# Altium footprint library nira_avr_dev_board.PcbLib: 49 footprints (part 3 of 4)
Each footprint in its own frame and in the unit in brackets; x right, y up, seen from the top. Pads: shape width x height; smd on the part's side, far side on the other; paste and mask are expansions set on the pad; w line width, h text height; cw(c..) or ccw(c..) is an arc to the next point about the centre after c.
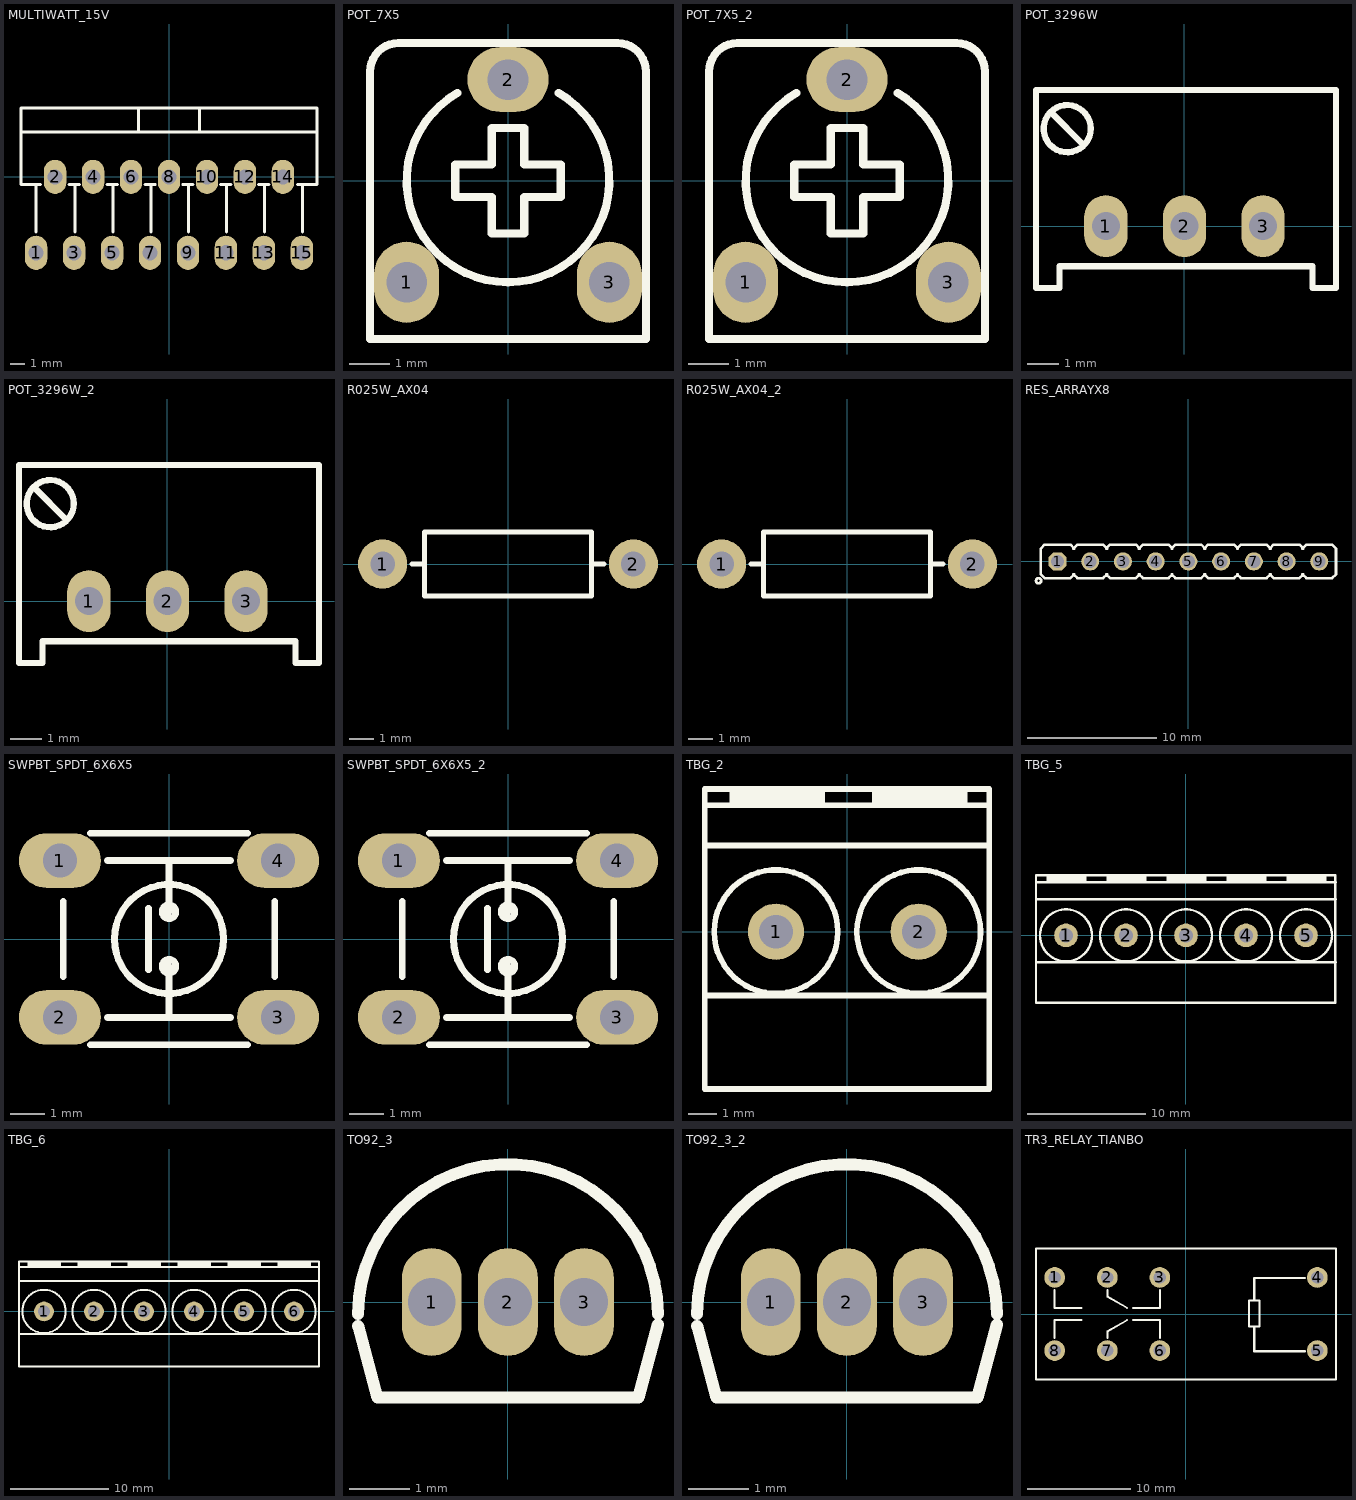
[diagram p2: the footprints below, top view; thin cyan lines are the x and y axes]

## MULTIWATT_15V [mil] "L298 straight MULTIWATT15 pitch: 1.27mm 20x5mm"
height 314.96
pads (15):
  oval 59.06x90 hole 40: 1(-350,-200) 2(-300,0) 3(-250,-200) 4(-200,0) 5(-150,-200) 6(-100,0) 7(-50,-200) 8(0,0) 9(50,-200) 10(100,0) 11(150,-200) 12(200,0) 13(250,-200) 14(300,0) 15(350,-200)
Top Overlay:
  lines w7.87: -389.76,118.11 389.76,118.11 ; -350.39,-145.67 -350.39,-20 ; -338.58,-20 -389.76,-20 -389.76,181.1 389.76,181.1 389.76,-20 338.58,-20 ; -263.78,-19.68 -236.22,-19.68 ; -248.03,-145.67 -248.03,-19.68 ; -163.78,-19.68 -136.22,-19.68 ; -148.03,-145.67 -148.03,-19.68 ; -80,120 -80,180 ; -63.78,-19.68 -36.22,-19.68 ; -48.03,-145.67 -48.03,-19.68 ; 36.22,-19.68 63.78,-19.68 ; 51.97,-145.67 51.97,-19.68 ; 80,120 80,180 ; 136.22,-19.68 163.78,-19.68 ; 151.97,-145.67 151.97,-19.68 ; 236.22,-19.68 263.78,-19.68 ; 251.97,-145.67 251.97,-19.68 ; 351.97,-145.67 351.97,-19.68
3D body "User Library-Multiwatt15V.STEP": height 818.9, standoff -59.06, extent -385.83,-212.6 385.83,176.77

## POT_7X5 [mm]
height 3.2
pads (3):
  oval 1.6x2 hole 1: 1(-2.5,-2.5) 3(2.5,-2.5)
  oval 2x1.6 hole 1: 2(0,2.5)
Top Overlay:
  lines w0.2: -1.25,2.165 ccw(c0,0) 1.25,2.165 ; -3.4,-3.9 -3.4,2.7 cw(c-2.7,2.7) -2.7,3.4 2.7,3.4 cw(c2.7,2.7) 3.4,2.7 3.4,-3.9 -3.4,-3.9 ; -1.3,-0.4 -1.3,0.4 -0.4,0.4 -0.4,1.3 0.4,1.3 0.4,0.4 1.3,0.4 1.3,-0.4 0.4,-0.4 0.4,-1.3 -0.4,-1.3 -0.4,-0.4 -1.3,-0.4
3D body "User Library-Pot - RES_VAR1.STEP": height 7, standoff -3.9, extent -3.25,-3.775 3.25,3.275

## POT_7X5_2 [mm]
pads (3):
  oval 1.6x2 hole 1: 1(-2.5,-2.5) 3(2.5,-2.5)
  oval 2x1.6 hole 1: 2(0,2.5)
Top Overlay:
  lines w0.2: -1.25,2.165 ccw(c0,0) 1.25,2.165 ; -3.4,-3.9 -3.4,2.7 cw(c-2.7,2.7) -2.7,3.4 2.7,3.4 cw(c2.7,2.7) 3.4,2.7 3.4,-3.9 -3.4,-3.9 ; -1.3,-0.4 -1.3,0.4 -0.4,0.4 -0.4,1.3 0.4,1.3 0.4,0.4 1.3,0.4 1.3,-0.4 0.4,-0.4 0.4,-1.3 -0.4,-1.3 -0.4,-0.4 -1.3,-0.4
3D body "User Library-Pot - RES_VAR1.STEP": height 7, standoff -3.9, extent -3.25,-3.775 3.25,3.275

## POT_3296W [mm]
height 3.2
pads (3):
  oval 1.4x2 / inner round 1.2 / far side oval 1.4x2 hole 0.9: 1(-2.54,0) 2(0,0) 3(2.54,0)
Top Overlay:
  circle w0.2: c-3.791,3.151 r0.762
  lines w0.2: -4.299,3.659 -3.283,2.643 ; -4.8,-2 -4.8,4.4 4.9,4.4 4.9,-2 4.145,-2 4.145,-1.3 -4.045,-1.3 -4.045,-2 -4.8,-2
3D body "pot 3299W-1-103RLF.step": height 11.56, standoff -6.22, extent -4.725,-1.848 4.8,4.248

## POT_3296W_2 [mm]
pads (3):
  oval 1.4x2 / inner round 1.2 / far side oval 1.4x2 hole 0.9: 1(-2.54,0) 2(0,0) 3(2.54,0)
Top Overlay:
  circle w0.2: c-3.791,3.151 r0.762
  lines w0.2: -4.299,3.659 -3.283,2.643 ; -4.8,-2 -4.045,-2 -4.045,-1.3 4.145,-1.3 4.145,-2 4.9,-2 4.9,4.4 -4.8,4.4 -4.8,-2
3D body "pot 3299W-1-103RLF.step": height 11.56, standoff -6.22, extent -4.725,-1.848 4.8,4.248

## R025W_AX04 [mm]
height 3.2
pads (2):
  round 2 hole 1: 1(-5.1,0) 2(5.1,0)
Top Overlay:
  lines w0.2: -3.9,0 -3.4,0 ; 3.375,-1.3 -3.4,-1.3 -3.4,1.3 3.375,1.3 ; 3.4,-1.3 3.4,1.3 ; 3.4,0 3.9,0
3D body "RESTH_Axial-0.4.STEP": height 2.6, standoff -2.54, extent -5.38,-1.277 5.38,1.277

## R025W_AX04_2 [mm]
pads (2):
  round 2 hole 1: 1(-5.1,0) 2(5.1,0)
Top Overlay:
  lines w0.2: -3.9,0 -3.4,0 ; 3.375,-1.3 -3.4,-1.3 -3.4,1.3 3.375,1.3 ; 3.4,-1.3 3.4,1.3 ; 3.4,0 3.9,0
3D body "RESTH_Axial-0.4.STEP": height 2.6, standoff -2.54, extent -5.38,-1.277 5.38,1.277

## RES_ARRAYX8 [mm]
height 8
pads (9):
  oct 1.4x1.4 / inner oct 1.4x1.4 / far side oct 1.4x2.2 hole 1 mask+0.1: 1(-10.16,0)
  round 1.4 / inner round 1.4 / far side oval 1.4x2.2 hole 1 mask+0.1: 2(-7.62,0) 3(-5.08,0) 4(-2.54,0) 5(0,0) 6(2.54,0) 7(5.08,0) 8(7.62,0) 9(10.16,0)
Top Overlay:
  circle w0.2: c-11.63,-1.5 r0.2
  lines w0.2: -8.92,-1 -8.62,-1.3 -6.62,-1.3 -6.32,-1 ; -8.92,1 -8.62,1.3 -6.62,1.3 -6.32,1 ; -8.86,-1 -9.16,-1.3 -11.16,-1.3 -11.46,-1 -11.46,1 -11.16,1.3 -9.16,1.3 -8.86,1 ; -6.38,-1 -6.08,-1.3 -4.08,-1.3 -3.78,-1 ; -6.38,1 -6.08,1.3 -4.08,1.3 -3.78,1 ; -3.84,-1 -3.54,-1.3 -1.54,-1.3 -1.24,-1 ; -3.84,1 -3.54,1.3 -1.54,1.3 -1.24,1 ; -1.3,-1 -1,-1.3 1,-1.3 1.3,-1 ; -1.3,1 -1,1.3 1,1.3 1.3,1 ; 1.24,-1 1.54,-1.3 3.54,-1.3 3.84,-1 ; 1.24,1 1.54,1.3 3.54,1.3 3.84,1 ; 3.78,-1 4.08,-1.3 6.08,-1.3 6.38,-1 ; 3.78,1 4.08,1.3 6.08,1.3 6.38,1 ; 6.32,-1 6.62,-1.3 8.62,-1.3 8.92,-1 ; 6.32,1 6.62,1.3 8.62,1.3 8.92,1 ; 8.86,-1 9.16,-1.3 11.16,-1.3 11.46,-1 11.46,1 11.16,1.3 9.16,1.3 8.86,1
3D body "User Library-Resistor Pack 8.STEP": height 6.43, standoff -2, extent -11.405,-1.3 11.405,1.2

## SWPBT_SPDT_6X6X5 [mm]
height 3.2
pads (4):
  oval 2.4x1.6 hole 1 mask+0.1: 1(-3.2,2.3) 2(-3.2,-2.3) 3(3.2,-2.3) 4(3.2,2.3)
Top Overlay:
  circle w0.2: c0,-0.8 r0.2
  circle w0.2: c0,0.8 r0.2
  circle w0.2: c0,0 r1.6
  lines w0.2: -3.1,-1.1 -3.1,1.1 ; -2.3,-3.1 2.3,-3.1 ; -2.3,3.1 2.3,3.1 ; -1.8,-2.3 1.8,-2.3 ; -1.8,2.3 1.8,2.3 ; -0.6,-0.9 -0.6,0.9 ; 0,-2.3 0,-0.8 ; 0,0.8 0,2.3 ; 3.1,-1.1 3.1,1.1
3D body "Tactile switch 6x6x5mm.step": height 5.01, standoff -3.51, extent -3.872,-3.015 3.871,3.015

## SWPBT_SPDT_6X6X5_2 [mm]
pads (4):
  oval 2.4x1.6 hole 1 mask+0.1: 1(-3.2,2.3) 2(-3.2,-2.3) 3(3.2,-2.3) 4(3.2,2.3)
Top Overlay:
  circle w0.2: c0,0 r1.6
  circle w0.2: c0,0.8 r0.2
  circle w0.2: c0,-0.8 r0.2
  lines w0.2: -3.1,-1.1 -3.1,1.1 ; -2.3,-3.1 2.3,-3.1 ; -2.3,3.1 2.3,3.1 ; -1.8,-2.3 1.8,-2.3 ; -1.8,2.3 1.8,2.3 ; -0.6,-0.9 -0.6,0.9 ; 0,-2.3 0,-0.8 ; 0,0.8 0,2.3 ; 3.1,-1.1 3.1,1.1
3D body "Tactile switch 6x6x5mm.step": height 5.01, standoff -3.51, extent -3.872,-3.015 3.871,3.015

## TBG_2 [mm]
height 3.2
pads (2):
  round 2 / inner round 2 / far side oval 2.4x3 hole 1.2: 1(-2.54,0) 2(2.54,0)
Top Overlay:
  circle w0.2: c2.54,0 r2.2
  circle w0.2: c-2.54,0 r2.2
  rectangle: 0.88,4.5 4.28,5.08
  rectangle: -4.2,4.5 -0.8,5.08
  lines w0.2: -5.08,-2.27 5.055,-2.27 ; -5.08,3.07 5.055,3.07 ; -5.08,4.5 5.055,4.5 ; -5.08,-5.6 -5.08,5.08 5.055,5.08 5.055,-5.6 -5.08,-5.6
3D body "User Library-klema-5mm-2pin.step": height 14, standoff -4, extent -5,-5.5 5,5

## TBG_5 [mm]
height 3.2
pads (5):
  round 2 / inner round 2 / far side oval 2.4x3 hole 1.2: 1(-10.16,0) 2(-5.08,0) 3(0,0) 4(5.08,0) 5(10.16,0)
Top Overlay:
  circle w0.2: c10.16,0 r2.2
  circle w0.2: c5.08,0 r2.2
  circle w0.2: c0,0 r2.2
  circle w0.2: c-5.08,0 r2.2
  circle w0.2: c-10.16,0 r2.2
  rectangle: 8.5,4.501 11.9,5.081
  rectangle: 3.419,4.5 6.819,5.08
  rectangle: -1.66,4.501 1.74,5.081
  rectangle: -6.74,4.499 -3.34,5.079
  rectangle: -11.82,4.501 -8.42,5.081
  lines w0.2: -12.7,-2.27 12.7,-2.27 ; -12.7,3.07 12.7,3.07 ; -12.7,4.5 12.7,4.5 ; -12.7,-5.7 12.649,-5.7 12.649,5.08 -12.7,5.08 -12.7,-5.7
3D body "User Library-klema-5mm-2pin.step": height 14, standoff -4, extent 2.62,-5.5 12.62,5
3D body "User Library-klema-5mm-3pin.step": height 14.1, standoff -3.9, extent -12.58,-5.5 2.42,5

## TBG_6 [mm]
height 3.2
pads (6):
  round 2 / inner round 2 / far side oval 2.4x3 hole 1.2: 1(-12.7,0) 2(-7.62,0) 3(-2.54,0) 4(2.54,0) 5(7.62,0) 6(12.7,0)
Top Overlay:
  circle w0.2: c-12.7,0 r2.2
  circle w0.2: c-7.62,0 r2.2
  circle w0.2: c-2.54,0 r2.2
  circle w0.2: c2.54,0 r2.2
  circle w0.2: c7.62,0 r2.2
  circle w0.2: c12.7,0 r2.2
  rectangle: -14.36,4.5 -10.96,5.08
  rectangle: -9.28,4.5 -5.88,5.08
  rectangle: -4.2,4.5 -0.8,5.08
  rectangle: 0.88,4.5 4.28,5.08
  rectangle: 5.96,4.5 9.36,5.08
  rectangle: 11.04,4.5 14.44,5.08
  lines w0.2: -15.24,-2.27 15.2,-2.27 ; -15.24,3.07 15.2,3.07 ; -15.24,4.5 15.2,4.5 ; -15.24,-5.6 15.24,-5.6 15.24,5.08 -15.24,5.08 -15.24,-5.6
3D body "User Library-klema-5mm-3pin.step": height 14.1, standoff -3.9, extent 0.12,-5.5 15.12,5
3D body "User Library-klema-5mm-3pin.step": height 14.1, standoff -3.9, extent -15.12,-5.5 -0.12,5

## TO92_3 [mm]
height 3.2
pads (3):
  oval 1x1.8 hole 0.8 mask+0.1: 1(-1.27,0) 2(0,0) 3(1.27,0)
Top Overlay:
  lines w0.2: -2.5,-0.2 cw(c0,-0.2) 2.5,-0.2 ; -2.497,-0.399 -2.178,-1.589 2.178,-1.589 2.504,-0.374
3D body "User Library-KSP92 Transistors PNP TO-92 3L (2,54mm).step": height 4.82, standoff -14.7, extent -2.38,-1.45 2.38,2.18

## TO92_3_2 [mm]
pads (3):
  oval 1x1.8 hole 0.8 mask+0.1: 1(-1.27,0) 2(0,0) 3(1.27,0)
Top Overlay:
  lines w0.2: -2.5,-0.2 cw(c0,-0.2) 2.5,-0.2 ; -2.497,-0.399 -2.178,-1.589 2.178,-1.589 2.504,-0.374
3D body "User Library-KSP92 Transistors PNP TO-92 3L (2,54mm).step": height 4.82, standoff -14.7, extent -2.38,-1.45 2.38,2.18

## TR3_RELAY_TIANBO [mm]
height 8
pads (8):
  round 2 hole 1.2: 1(-12.69,3.53) 2(-7.61,3.53) 3(-2.53,3.53) 4(12.69,3.53) 5(12.69,-3.53) 6(-2.53,-3.53) 7(-7.61,-3.53) 8(-12.69,-3.53)
Top Overlay:
  lines w0.2: -12.7,-2.3 -12.7,-0.6 -10.1,-0.6 ; -12.7,2.3 -12.7,0.6 -10.1,0.6 ; -7.6,-2.3 -7.6,-1.7 -5.7,-0.6 ; -7.6,2.3 -7.6,1.7 -5.7,0.6 ; -5.1,-0.6 -2.5,-0.6 -2.5,-2.3 ; -5.1,0.6 -2.5,0.6 -2.5,2.3 ; 6.6,-1.2 6.6,-3.6 11.5,-3.6 ; 6.6,1.3 6.6,3.5 11.5,3.5 ; -14.5,-6.35 14.5,-6.35 14.5,6.35 -14.5,6.35 -14.5,-6.35 ; 6.1,-1.2 7.1,-1.2 7.1,1.3 6.1,1.3 6.1,-1.2